# Altium integrated library Weidmueller_OMNIMATE_Signal.IntLib: 2550 symbols (part 21 of 45)
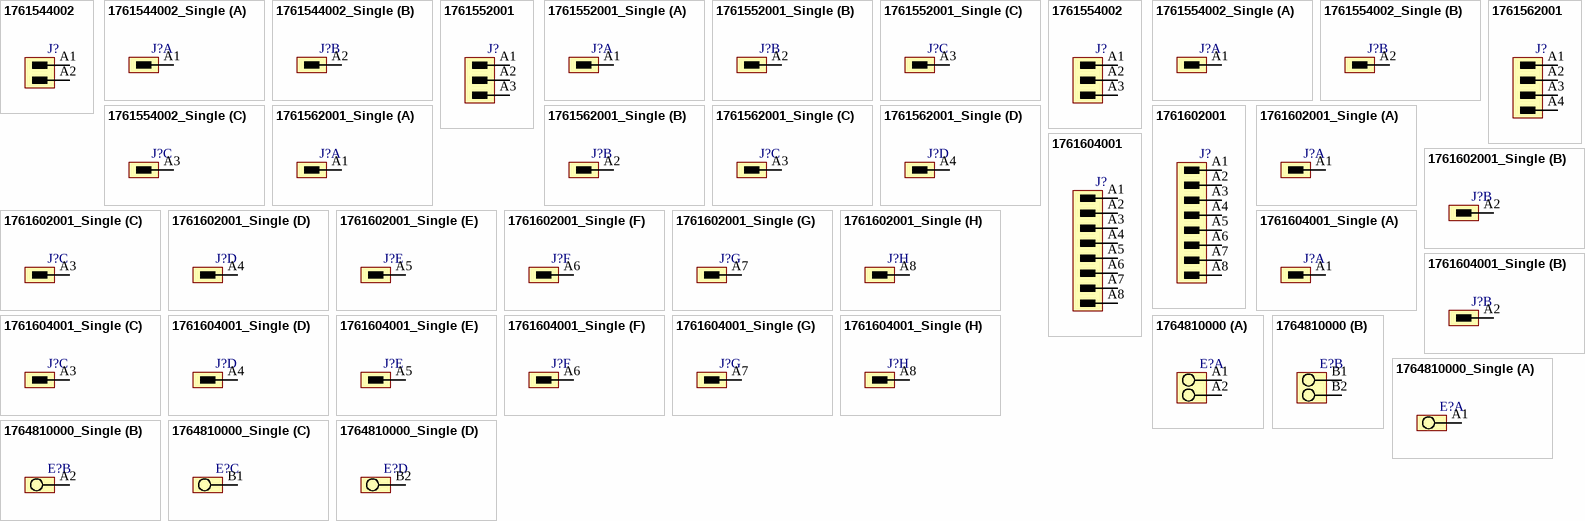
[diagram p231: symbols 1761544002 to 1764810000_Single]

## 1764810000_Single
designator E?
OMNIMATE Signal - series LMZF; PartNumber: 1764810000; Manufacturer: Weidmueller; Short_text_for_material: LM2NZF 5.08/04/135 3.5SN OR BX; Side_termination_characteristic: closed side; Mounting_onto_the_PCB: Solder connection; Pitch_mm: 5,08 mm; Pitch_inch: 0,2 inch; No_of_poles: 4; Solder_pin_length_mm: 3,5 mm; Contact_material: Cu-Leg; Contact_surface: tinned; Insulating_material: PA; UL_94_flammability_rating: V-2; Rated_voltage_for_surge_voltage_class_pollution_degree_II_2: 630 V; Solid_min_H05_07_V_U: 0,2 mm²; Solid_max_H05_07_V_U: 2,5 mm²; Rated_voltage_use_group_B_UL_1059: 300 V; Rated_current_use_group_B_UL_1059: 10 A; Wire_cross_section_AWG_min_UL_1059: AWG 24; Wire_cross_section_AWG_max_UL_1059: AWG 14; PackageReference: LM2NZF_5_08_04; Colour: Orange; Packaging: Box; Qty: 50 PCS; Revision: V1; ComponentLink1Description: Manufacturer URL; ComponentLink1URL: http://www.weidmueller.com/; ComponentLink2Description: URL Link1; ComponentLink2URL: http://catalog.weidmueller.com/catalog/Start.do?localeId=en&ObjectID=1764810000
footprint LM2NZF_5_08_04 (OMNIMATE Signal - Serie LMZF  LM2NZF 5.08/04/135 3.5)
part A pins: A1
part B pins: A2
part C pins: B1
part D pins: B2
1 alternate drawing of the same symbol

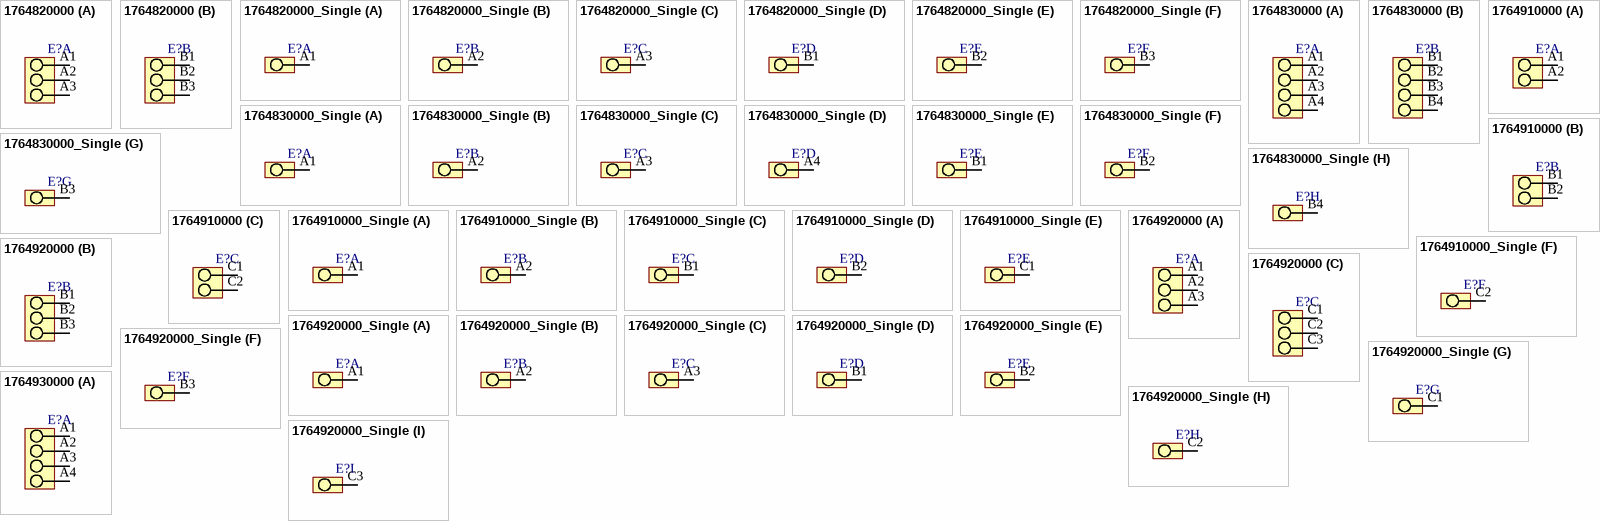
[diagram p113: symbols 1764820000 to 1764930000]

## 1764820000
designator E?
OMNIMATE Signal - series LMZF; PartNumber: 1764820000; Manufacturer: Weidmueller; Short_text_for_material: LM2NZF 5.08/06/135 3.5SN OR BX; Side_termination_characteristic: closed side; Mounting_onto_the_PCB: Solder connection; Pitch_mm: 5,08 mm; Pitch_inch: 0,2 inch; No_of_poles: 6; Solder_pin_length_mm: 3,5 mm; Contact_material: Cu-Leg; Contact_surface: tinned; Insulating_material: PA; UL_94_flammability_rating: V-2; Rated_voltage_for_surge_voltage_class_pollution_degree_II_2: 630 V; Solid_min_H05_07_V_U: 0,2 mm²; Solid_max_H05_07_V_U: 2,5 mm²; Rated_voltage_use_group_B_UL_1059: 300 V; Rated_current_use_group_B_UL_1059: 10 A; Wire_cross_section_AWG_min_UL_1059: AWG 24; Wire_cross_section_AWG_max_UL_1059: AWG 14; PackageReference: LM2NZF_5_08_06; Colour: Orange; Packaging: Box; Qty: 50 PCS; Revision: V1; ComponentLink1Description: Manufacturer URL; ComponentLink1URL: http://www.weidmueller.com/; ComponentLink2Description: URL Link1; ComponentLink2URL: http://catalog.weidmueller.com/catalog/Start.do?localeId=en&ObjectID=1764820000
footprint LM2NZF_5_08_06 (OMNIMATE Signal - Serie LMZF  LM2NZF 5.08/06/135 3.5)
part A pins: A1, A2, A3
part B pins: B1, B2, B3
1 alternate drawing of the same symbol

## 1764820000_Single
designator E?
OMNIMATE Signal - series LMZF; PartNumber: 1764820000; Manufacturer: Weidmueller; Short_text_for_material: LM2NZF 5.08/06/135 3.5SN OR BX; Side_termination_characteristic: closed side; Mounting_onto_the_PCB: Solder connection; Pitch_mm: 5,08 mm; Pitch_inch: 0,2 inch; No_of_poles: 6; Solder_pin_length_mm: 3,5 mm; Contact_material: Cu-Leg; Contact_surface: tinned; Insulating_material: PA; UL_94_flammability_rating: V-2; Rated_voltage_for_surge_voltage_class_pollution_degree_II_2: 630 V; Solid_min_H05_07_V_U: 0,2 mm²; Solid_max_H05_07_V_U: 2,5 mm²; Rated_voltage_use_group_B_UL_1059: 300 V; Rated_current_use_group_B_UL_1059: 10 A; Wire_cross_section_AWG_min_UL_1059: AWG 24; Wire_cross_section_AWG_max_UL_1059: AWG 14; PackageReference: LM2NZF_5_08_06; Colour: Orange; Packaging: Box; Qty: 50 PCS; Revision: V1; ComponentLink1Description: Manufacturer URL; ComponentLink1URL: http://www.weidmueller.com/; ComponentLink2Description: URL Link1; ComponentLink2URL: http://catalog.weidmueller.com/catalog/Start.do?localeId=en&ObjectID=1764820000
footprint LM2NZF_5_08_06 (OMNIMATE Signal - Serie LMZF  LM2NZF 5.08/06/135 3.5)
part A pins: A1
part B pins: A2
part C pins: A3
part D pins: B1
part E pins: B2
part F pins: B3
1 alternate drawing of the same symbol

## 1764830000
designator E?
OMNIMATE Signal - series LMZF; PartNumber: 1764830000; Manufacturer: Weidmueller; Short_text_for_material: LM2NZF 5.08/08/135 3.5SN OR BX; Side_termination_characteristic: closed side; Mounting_onto_the_PCB: Solder connection; Pitch_mm: 5,08 mm; Pitch_inch: 0,2 inch; No_of_poles: 8; Solder_pin_length_mm: 3,5 mm; Contact_material: Cu-Leg; Contact_surface: tinned; Insulating_material: PA; UL_94_flammability_rating: V-2; Rated_voltage_for_surge_voltage_class_pollution_degree_II_2: 630 V; Solid_min_H05_07_V_U: 0,2 mm²; Solid_max_H05_07_V_U: 2,5 mm²; Rated_voltage_use_group_B_UL_1059: 300 V; Rated_current_use_group_B_UL_1059: 10 A; Wire_cross_section_AWG_min_UL_1059: AWG 24; Wire_cross_section_AWG_max_UL_1059: AWG 14; PackageReference: LM2NZF_5_08_08; Colour: Orange; Packaging: Box; Qty: 50 PCS; Revision: V1; ComponentLink1Description: Manufacturer URL; ComponentLink1URL: http://www.weidmueller.com/; ComponentLink2Description: URL Link1; ComponentLink2URL: http://catalog.weidmueller.com/catalog/Start.do?localeId=en&ObjectID=1764830000
footprint LM2NZF_5_08_08 (OMNIMATE Signal - Serie LMZF  LM2NZF 5.08/08/135 3.5)
part A pins: A1, A2, A3, A4
part B pins: B1, B2, B3, B4
1 alternate drawing of the same symbol

## 1764830000_Single
designator E?
OMNIMATE Signal - series LMZF; PartNumber: 1764830000; Manufacturer: Weidmueller; Short_text_for_material: LM2NZF 5.08/08/135 3.5SN OR BX; Side_termination_characteristic: closed side; Mounting_onto_the_PCB: Solder connection; Pitch_mm: 5,08 mm; Pitch_inch: 0,2 inch; No_of_poles: 8; Solder_pin_length_mm: 3,5 mm; Contact_material: Cu-Leg; Contact_surface: tinned; Insulating_material: PA; UL_94_flammability_rating: V-2; Rated_voltage_for_surge_voltage_class_pollution_degree_II_2: 630 V; Solid_min_H05_07_V_U: 0,2 mm²; Solid_max_H05_07_V_U: 2,5 mm²; Rated_voltage_use_group_B_UL_1059: 300 V; Rated_current_use_group_B_UL_1059: 10 A; Wire_cross_section_AWG_min_UL_1059: AWG 24; Wire_cross_section_AWG_max_UL_1059: AWG 14; PackageReference: LM2NZF_5_08_08; Colour: Orange; Packaging: Box; Qty: 50 PCS; Revision: V1; ComponentLink1Description: Manufacturer URL; ComponentLink1URL: http://www.weidmueller.com/; ComponentLink2Description: URL Link1; ComponentLink2URL: http://catalog.weidmueller.com/catalog/Start.do?localeId=en&ObjectID=1764830000
footprint LM2NZF_5_08_08 (OMNIMATE Signal - Serie LMZF  LM2NZF 5.08/08/135 3.5)
part A pins: A1
part B pins: A2
part C pins: A3
part D pins: A4
part E pins: B1
part F pins: B2
part G pins: B3
part H pins: B4
1 alternate drawing of the same symbol

## 1764910000
designator E?
OMNIMATE Signal - series LMZF; PartNumber: 1764910000; Manufacturer: Weidmueller; Short_text_for_material: LM3RZF 5.08/06/135 3.5SN OR BX; Side_termination_characteristic: closed side; Mounting_onto_the_PCB: Solder connection; Pitch_mm: 5,08 mm; Pitch_inch: 0,2 inch; No_of_poles: 6; Solder_pin_length_mm: 3,5 mm; Contact_material: Cu-Leg; Contact_surface: tinned; Insulating_material: PA; UL_94_flammability_rating: V-2; Rated_voltage_for_surge_voltage_class_pollution_degree_II_2: 630 V; Solid_min_H05_07_V_U: 0,2 mm²; Solid_max_H05_07_V_U: 2,5 mm²; Rated_voltage_use_group_B_UL_1059: 300 V; Rated_current_use_group_B_UL_1059: 10 A; Wire_cross_section_AWG_min_UL_1059: AWG 24; Wire_cross_section_AWG_max_UL_1059: AWG 14; PackageReference: LM3RZF_5_08_06; Colour: Orange; Packaging: Box; Qty: 50 PCS; Revision: V1; ComponentLink1Description: Manufacturer URL; ComponentLink1URL: http://www.weidmueller.com/; ComponentLink2Description: URL Link1; ComponentLink2URL: http://catalog.weidmueller.com/catalog/Start.do?localeId=en&ObjectID=1764910000
footprint LM3RZF_5_08_06 (OMNIMATE Signal - Serie LMZF  LM3RZF 5.08/06/135 3.5)
part A pins: A1, A2
part B pins: B1, B2
part C pins: C1, C2
1 alternate drawing of the same symbol

## 1764910000_Single
designator E?
OMNIMATE Signal - series LMZF; PartNumber: 1764910000; Manufacturer: Weidmueller; Short_text_for_material: LM3RZF 5.08/06/135 3.5SN OR BX; Side_termination_characteristic: closed side; Mounting_onto_the_PCB: Solder connection; Pitch_mm: 5,08 mm; Pitch_inch: 0,2 inch; No_of_poles: 6; Solder_pin_length_mm: 3,5 mm; Contact_material: Cu-Leg; Contact_surface: tinned; Insulating_material: PA; UL_94_flammability_rating: V-2; Rated_voltage_for_surge_voltage_class_pollution_degree_II_2: 630 V; Solid_min_H05_07_V_U: 0,2 mm²; Solid_max_H05_07_V_U: 2,5 mm²; Rated_voltage_use_group_B_UL_1059: 300 V; Rated_current_use_group_B_UL_1059: 10 A; Wire_cross_section_AWG_min_UL_1059: AWG 24; Wire_cross_section_AWG_max_UL_1059: AWG 14; PackageReference: LM3RZF_5_08_06; Colour: Orange; Packaging: Box; Qty: 50 PCS; Revision: V1; ComponentLink1Description: Manufacturer URL; ComponentLink1URL: http://www.weidmueller.com/; ComponentLink2Description: URL Link1; ComponentLink2URL: http://catalog.weidmueller.com/catalog/Start.do?localeId=en&ObjectID=1764910000
footprint LM3RZF_5_08_06 (OMNIMATE Signal - Serie LMZF  LM3RZF 5.08/06/135 3.5)
part A pins: A1
part B pins: A2
part C pins: B1
part D pins: B2
part E pins: C1
part F pins: C2
1 alternate drawing of the same symbol

## 1764920000
designator E?
OMNIMATE Signal - series LMZF; PartNumber: 1764920000; Manufacturer: Weidmueller; Short_text_for_material: LM3RZF 5.08/09/135 3.5SN OR BX; Side_termination_characteristic: closed side; Mounting_onto_the_PCB: Solder connection; Pitch_mm: 5,08 mm; Pitch_inch: 0,2 inch; No_of_poles: 9; Solder_pin_length_mm: 3,5 mm; Contact_material: Cu-Leg; Contact_surface: tinned; Insulating_material: PA; UL_94_flammability_rating: V-2; Rated_voltage_for_surge_voltage_class_pollution_degree_II_2: 630 V; Solid_min_H05_07_V_U: 0,2 mm²; Solid_max_H05_07_V_U: 2,5 mm²; Rated_voltage_use_group_B_UL_1059: 300 V; Rated_current_use_group_B_UL_1059: 10 A; Wire_cross_section_AWG_min_UL_1059: AWG 24; Wire_cross_section_AWG_max_UL_1059: AWG 14; PackageReference: LM3RZF_5_08_09; Colour: Orange; Packaging: Box; Qty: 50 PCS; Revision: V1; ComponentLink1Description: Manufacturer URL; ComponentLink1URL: http://www.weidmueller.com/; ComponentLink2Description: URL Link1; ComponentLink2URL: http://catalog.weidmueller.com/catalog/Start.do?localeId=en&ObjectID=1764920000
footprint LM3RZF_5_08_09 (OMNIMATE Signal - Serie LMZF  LM3RZF 5.08/9/135 3.5)
part A pins: A1, A2, A3
part B pins: B1, B2, B3
part C pins: C1, C2, C3
1 alternate drawing of the same symbol

## 1764920000_Single
designator E?
OMNIMATE Signal - series LMZF; PartNumber: 1764920000; Manufacturer: Weidmueller; Short_text_for_material: LM3RZF 5.08/09/135 3.5SN OR BX; Side_termination_characteristic: closed side; Mounting_onto_the_PCB: Solder connection; Pitch_mm: 5,08 mm; Pitch_inch: 0,2 inch; No_of_poles: 9; Solder_pin_length_mm: 3,5 mm; Contact_material: Cu-Leg; Contact_surface: tinned; Insulating_material: PA; UL_94_flammability_rating: V-2; Rated_voltage_for_surge_voltage_class_pollution_degree_II_2: 630 V; Solid_min_H05_07_V_U: 0,2 mm²; Solid_max_H05_07_V_U: 2,5 mm²; Rated_voltage_use_group_B_UL_1059: 300 V; Rated_current_use_group_B_UL_1059: 10 A; Wire_cross_section_AWG_min_UL_1059: AWG 24; Wire_cross_section_AWG_max_UL_1059: AWG 14; PackageReference: LM3RZF_5_08_09; Colour: Orange; Packaging: Box; Qty: 50 PCS; Revision: V1; ComponentLink1Description: Manufacturer URL; ComponentLink1URL: http://www.weidmueller.com/; ComponentLink2Description: URL Link1; ComponentLink2URL: http://catalog.weidmueller.com/catalog/Start.do?localeId=en&ObjectID=1764920000
footprint LM3RZF_5_08_09 (OMNIMATE Signal - Serie LMZF  LM3RZF 5.08/9/135 3.5)
part A pins: A1
part B pins: A2
part C pins: A3
part D pins: B1
part E pins: B2
part F pins: B3
part G pins: C1
part H pins: C2
part I pins: C3
1 alternate drawing of the same symbol

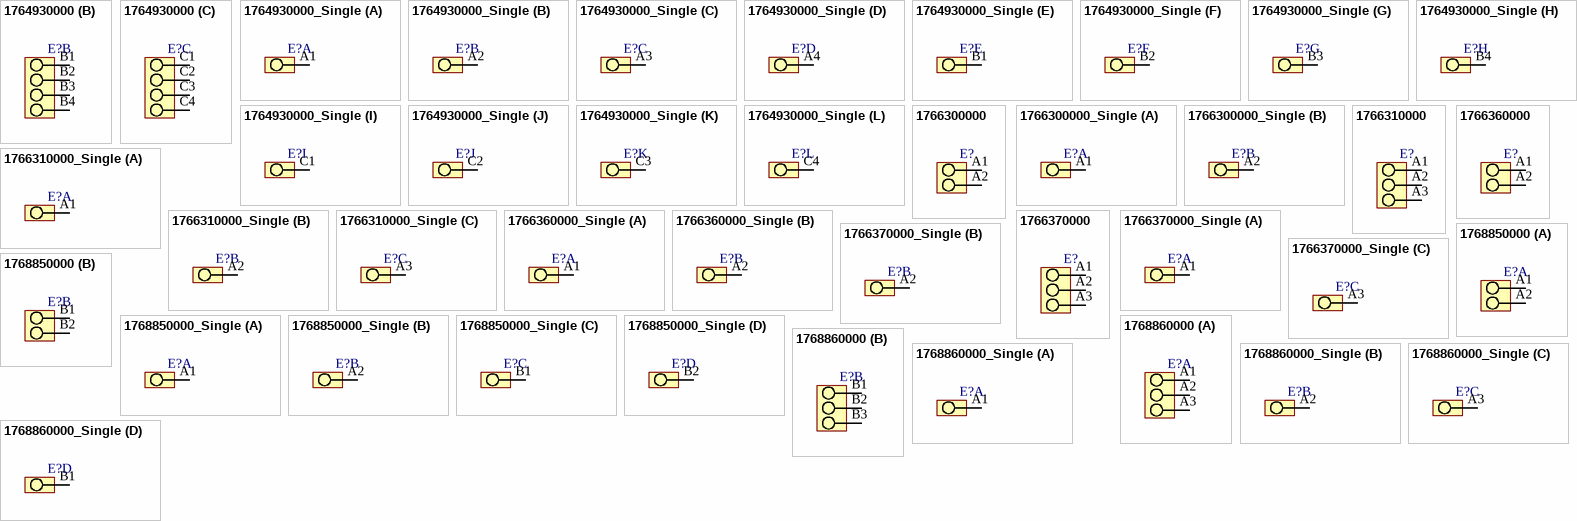
[diagram p114: symbols 1764930000 to 1768860000_Single]

## 1764930000
designator E?
OMNIMATE Signal - series LMZF; PartNumber: 1764930000; Manufacturer: Weidmueller; Short_text_for_material: LM3RZF 5.08/12/135 3.5SN OR BX; Side_termination_characteristic: closed side; Mounting_onto_the_PCB: Solder connection; Pitch_mm: 5,08 mm; Pitch_inch: 0,2 inch; No_of_poles: 12; Solder_pin_length_mm: 3,5 mm; Contact_material: Cu-Leg; Contact_surface: tinned; Insulating_material: PA; UL_94_flammability_rating: V-2; Rated_voltage_for_surge_voltage_class_pollution_degree_II_2: 630 V; Solid_min_H05_07_V_U: 0,2 mm²; Solid_max_H05_07_V_U: 2,5 mm²; Rated_voltage_use_group_B_UL_1059: 300 V; Rated_current_use_group_B_UL_1059: 10 A; Wire_cross_section_AWG_min_UL_1059: AWG 24; Wire_cross_section_AWG_max_UL_1059: AWG 14; PackageReference: LM3RZF_5_08_12; Colour: Orange; Packaging: Box; Qty: 50 PCS; Revision: V1; ComponentLink1Description: Manufacturer URL; ComponentLink1URL: http://www.weidmueller.com/; ComponentLink2Description: URL Link1; ComponentLink2URL: http://catalog.weidmueller.com/catalog/Start.do?localeId=en&ObjectID=1764930000
footprint LM3RZF_5_08_12 (OMNIMATE Signal - Serie LMZF  LM3RZF 5.08/12/135 3.5)
part A pins: A1, A2, A3, A4
part B pins: B1, B2, B3, B4
part C pins: C1, C2, C3, C4
1 alternate drawing of the same symbol

## 1764930000_Single
designator E?
OMNIMATE Signal - series LMZF; PartNumber: 1764930000; Manufacturer: Weidmueller; Short_text_for_material: LM3RZF 5.08/12/135 3.5SN OR BX; Side_termination_characteristic: closed side; Mounting_onto_the_PCB: Solder connection; Pitch_mm: 5,08 mm; Pitch_inch: 0,2 inch; No_of_poles: 12; Solder_pin_length_mm: 3,5 mm; Contact_material: Cu-Leg; Contact_surface: tinned; Insulating_material: PA; UL_94_flammability_rating: V-2; Rated_voltage_for_surge_voltage_class_pollution_degree_II_2: 630 V; Solid_min_H05_07_V_U: 0,2 mm²; Solid_max_H05_07_V_U: 2,5 mm²; Rated_voltage_use_group_B_UL_1059: 300 V; Rated_current_use_group_B_UL_1059: 10 A; Wire_cross_section_AWG_min_UL_1059: AWG 24; Wire_cross_section_AWG_max_UL_1059: AWG 14; PackageReference: LM3RZF_5_08_12; Colour: Orange; Packaging: Box; Qty: 50 PCS; Revision: V1; ComponentLink1Description: Manufacturer URL; ComponentLink1URL: http://www.weidmueller.com/; ComponentLink2Description: URL Link1; ComponentLink2URL: http://catalog.weidmueller.com/catalog/Start.do?localeId=en&ObjectID=1764930000
footprint LM3RZF_5_08_12 (OMNIMATE Signal - Serie LMZF  LM3RZF 5.08/12/135 3.5)
part A pins: A1
part B pins: A2
part C pins: A3
part D pins: A4
part E pins: B1
part F pins: B2
part G pins: B3
part H pins: B4
part I pins: C1
part J pins: C2
part K pins: C3
part L pins: C4
1 alternate drawing of the same symbol

## 1766300000
designator E?
OMNIMATE Signal - series LM; PartNumber: 1766300000; Manufacturer: Weidmueller; Short_text_for_material: LM1N 5.08/02/90 3.5SN OR BX; Side_termination_characteristic: closed side; Mounting_onto_the_PCB: Solder connection; Pitch_mm: 5,08 mm; Pitch_inch: 0,2 inch; No_of_poles: 2; Solder_pin_length_mm: 3,5 mm; Contact_material: Cu-Leg; Contact_surface: tinned; Insulating_material: Wemid (PA); UL_94_flammability_rating: V-0; Rated_voltage_for_surge_voltage_class_pollution_degree_II_2: 630 V; Solid_min_H05_07_V_U: 0,2 mm²; Solid_max_H05_07_V_U: 2,5 mm²; Rated_voltage_use_group_B_UL_1059: 300 V; Rated_current_use_group_B_UL_1059: 15 A; Wire_cross_section_AWG_min_UL_1059: AWG 24; Wire_cross_section_AWG_max_UL_1059: AWG 14; PackageReference: LM1N_5_08_02; Colour: Orange; Packaging: Box; Qty: 100 PCS; Revision: V1; ComponentLink1Description: Manufacturer URL; ComponentLink1URL: http://www.weidmueller.com/; ComponentLink2Description: URL Link1; ComponentLink2URL: http://catalog.weidmueller.com/catalog/Start.do?localeId=en&ObjectID=1766300000
footprint LM1N_5_08_02 (OMNIMATE Signal - Serie LM  LM1N 5.08/02/90 3.5)
pins: A1, A2
1 alternate drawing of the same symbol

## 1766300000_Single
designator E?
OMNIMATE Signal - series LM; PartNumber: 1766300000; Manufacturer: Weidmueller; Short_text_for_material: LM1N 5.08/02/90 3.5SN OR BX; Side_termination_characteristic: closed side; Mounting_onto_the_PCB: Solder connection; Pitch_mm: 5,08 mm; Pitch_inch: 0,2 inch; No_of_poles: 2; Solder_pin_length_mm: 3,5 mm; Contact_material: Cu-Leg; Contact_surface: tinned; Insulating_material: Wemid (PA); UL_94_flammability_rating: V-0; Rated_voltage_for_surge_voltage_class_pollution_degree_II_2: 630 V; Solid_min_H05_07_V_U: 0,2 mm²; Solid_max_H05_07_V_U: 2,5 mm²; Rated_voltage_use_group_B_UL_1059: 300 V; Rated_current_use_group_B_UL_1059: 15 A; Wire_cross_section_AWG_min_UL_1059: AWG 24; Wire_cross_section_AWG_max_UL_1059: AWG 14; PackageReference: LM1N_5_08_02; Colour: Orange; Packaging: Box; Qty: 100 PCS; Revision: V1; ComponentLink1Description: Manufacturer URL; ComponentLink1URL: http://www.weidmueller.com/; ComponentLink2Description: URL Link1; ComponentLink2URL: http://catalog.weidmueller.com/catalog/Start.do?localeId=en&ObjectID=1766300000
footprint LM1N_5_08_02 (OMNIMATE Signal - Serie LM  LM1N 5.08/02/90 3.5)
part A pins: A1
part B pins: A2
1 alternate drawing of the same symbol

## 1766310000
designator E?
OMNIMATE Signal - series LM; PartNumber: 1766310000; Manufacturer: Weidmueller; Short_text_for_material: LM1N 5.08/03/90 3.5SN OR BX; Side_termination_characteristic: closed side; Mounting_onto_the_PCB: Solder connection; Pitch_mm: 5,08 mm; Pitch_inch: 0,2 inch; No_of_poles: 3; Solder_pin_length_mm: 3,5 mm; Contact_material: Cu-Leg; Contact_surface: tinned; Insulating_material: Wemid (PA); UL_94_flammability_rating: V-0; Rated_voltage_for_surge_voltage_class_pollution_degree_II_2: 630 V; Solid_min_H05_07_V_U: 0,2 mm²; Solid_max_H05_07_V_U: 2,5 mm²; Rated_voltage_use_group_B_UL_1059: 300 V; Rated_current_use_group_B_UL_1059: 15 A; Wire_cross_section_AWG_min_UL_1059: AWG 24; Wire_cross_section_AWG_max_UL_1059: AWG 14; PackageReference: LM1N_5_08_03; Colour: Orange; Packaging: Box; Qty: 100 PCS; Revision: V1; ComponentLink1Description: Manufacturer URL; ComponentLink1URL: http://www.weidmueller.com/; ComponentLink2Description: URL Link1; ComponentLink2URL: http://catalog.weidmueller.com/catalog/Start.do?localeId=en&ObjectID=1766310000
footprint LM1N_5_08_03 (OMNIMATE Signal - Serie LM  LM1N 5.08/03/90 3.5)
pins: A1, A2, A3
1 alternate drawing of the same symbol

## 1766310000_Single
designator E?
OMNIMATE Signal - series LM; PartNumber: 1766310000; Manufacturer: Weidmueller; Short_text_for_material: LM1N 5.08/03/90 3.5SN OR BX; Side_termination_characteristic: closed side; Mounting_onto_the_PCB: Solder connection; Pitch_mm: 5,08 mm; Pitch_inch: 0,2 inch; No_of_poles: 3; Solder_pin_length_mm: 3,5 mm; Contact_material: Cu-Leg; Contact_surface: tinned; Insulating_material: Wemid (PA); UL_94_flammability_rating: V-0; Rated_voltage_for_surge_voltage_class_pollution_degree_II_2: 630 V; Solid_min_H05_07_V_U: 0,2 mm²; Solid_max_H05_07_V_U: 2,5 mm²; Rated_voltage_use_group_B_UL_1059: 300 V; Rated_current_use_group_B_UL_1059: 15 A; Wire_cross_section_AWG_min_UL_1059: AWG 24; Wire_cross_section_AWG_max_UL_1059: AWG 14; PackageReference: LM1N_5_08_03; Colour: Orange; Packaging: Box; Qty: 100 PCS; Revision: V1; ComponentLink1Description: Manufacturer URL; ComponentLink1URL: http://www.weidmueller.com/; ComponentLink2Description: URL Link1; ComponentLink2URL: http://catalog.weidmueller.com/catalog/Start.do?localeId=en&ObjectID=1766310000
footprint LM1N_5_08_03 (OMNIMATE Signal - Serie LM  LM1N 5.08/03/90 3.5)
part A pins: A1
part B pins: A2
part C pins: A3
1 alternate drawing of the same symbol

## 1766360000
designator E?
OMNIMATE Signal - series LM; PartNumber: 1766360000; Manufacturer: Weidmueller; Short_text_for_material: LM1H 5.08/02/90 3.5SN OR BX; Side_termination_characteristic: closed side; Mounting_onto_the_PCB: Solder connection; Pitch_mm: 5,08 mm; Pitch_inch: 0,2 inch; No_of_poles: 2; Solder_pin_length_mm: 3,5 mm; Contact_material: Cu-Leg; Contact_surface: tinned; Insulating_material: Wemid (PA); UL_94_flammability_rating: V-0; Rated_voltage_for_surge_voltage_class_pollution_degree_II_2: 630 V; Solid_min_H05_07_V_U: 0,2 mm²; Solid_max_H05_07_V_U: 2,5 mm²; Rated_voltage_use_group_B_UL_1059: 300 V; Rated_current_use_group_B_UL_1059: 15 A; Wire_cross_section_AWG_min_UL_1059: AWG 24; Wire_cross_section_AWG_max_UL_1059: AWG 14; PackageReference: LM1H_5_08_02; Colour: Orange; Packaging: Box; Qty: 100 PCS; Revision: V1; ComponentLink1Description: Manufacturer URL; ComponentLink1URL: http://www.weidmueller.com/; ComponentLink2Description: URL Link1; ComponentLink2URL: http://catalog.weidmueller.com/catalog/Start.do?localeId=en&ObjectID=1766360000
footprint LM1H_5_08_02 (OMNIMATE Signal - Serie LM  LM1H 5.08/02/90 3.5)
pins: A1, A2
1 alternate drawing of the same symbol

## 1766360000_Single
designator E?
OMNIMATE Signal - series LM; PartNumber: 1766360000; Manufacturer: Weidmueller; Short_text_for_material: LM1H 5.08/02/90 3.5SN OR BX; Side_termination_characteristic: closed side; Mounting_onto_the_PCB: Solder connection; Pitch_mm: 5,08 mm; Pitch_inch: 0,2 inch; No_of_poles: 2; Solder_pin_length_mm: 3,5 mm; Contact_material: Cu-Leg; Contact_surface: tinned; Insulating_material: Wemid (PA); UL_94_flammability_rating: V-0; Rated_voltage_for_surge_voltage_class_pollution_degree_II_2: 630 V; Solid_min_H05_07_V_U: 0,2 mm²; Solid_max_H05_07_V_U: 2,5 mm²; Rated_voltage_use_group_B_UL_1059: 300 V; Rated_current_use_group_B_UL_1059: 15 A; Wire_cross_section_AWG_min_UL_1059: AWG 24; Wire_cross_section_AWG_max_UL_1059: AWG 14; PackageReference: LM1H_5_08_02; Colour: Orange; Packaging: Box; Qty: 100 PCS; Revision: V1; ComponentLink1Description: Manufacturer URL; ComponentLink1URL: http://www.weidmueller.com/; ComponentLink2Description: URL Link1; ComponentLink2URL: http://catalog.weidmueller.com/catalog/Start.do?localeId=en&ObjectID=1766360000
footprint LM1H_5_08_02 (OMNIMATE Signal - Serie LM  LM1H 5.08/02/90 3.5)
part A pins: A1
part B pins: A2
1 alternate drawing of the same symbol

## 1766370000
designator E?
OMNIMATE Signal - series LM; PartNumber: 1766370000; Manufacturer: Weidmueller; Short_text_for_material: LM1H 5.08/03/90 3.5SN OR BX; Side_termination_characteristic: closed side; Mounting_onto_the_PCB: Solder connection; Pitch_mm: 5,08 mm; Pitch_inch: 0,2 inch; No_of_poles: 3; Solder_pin_length_mm: 3,5 mm; Contact_material: Cu-Leg; Contact_surface: tinned; Insulating_material: Wemid (PA); UL_94_flammability_rating: V-0; Rated_voltage_for_surge_voltage_class_pollution_degree_II_2: 630 V; Solid_min_H05_07_V_U: 0,2 mm²; Solid_max_H05_07_V_U: 2,5 mm²; Rated_voltage_use_group_B_UL_1059: 300 V; Rated_current_use_group_B_UL_1059: 15 A; Wire_cross_section_AWG_min_UL_1059: AWG 24; Wire_cross_section_AWG_max_UL_1059: AWG 14; PackageReference: LM1H_5_08_03; Colour: Orange; Packaging: Box; Qty: 100 PCS; Revision: V1; ComponentLink1Description: Manufacturer URL; ComponentLink1URL: http://www.weidmueller.com/; ComponentLink2Description: URL Link1; ComponentLink2URL: http://catalog.weidmueller.com/catalog/Start.do?localeId=en&ObjectID=1766370000
footprint LM1H_5_08_03 (OMNIMATE Signal - Serie LM  LM1H 5.08/03/90 3.5)
pins: A1, A2, A3
1 alternate drawing of the same symbol

## 1766370000_Single
designator E?
OMNIMATE Signal - series LM; PartNumber: 1766370000; Manufacturer: Weidmueller; Short_text_for_material: LM1H 5.08/03/90 3.5SN OR BX; Side_termination_characteristic: closed side; Mounting_onto_the_PCB: Solder connection; Pitch_mm: 5,08 mm; Pitch_inch: 0,2 inch; No_of_poles: 3; Solder_pin_length_mm: 3,5 mm; Contact_material: Cu-Leg; Contact_surface: tinned; Insulating_material: Wemid (PA); UL_94_flammability_rating: V-0; Rated_voltage_for_surge_voltage_class_pollution_degree_II_2: 630 V; Solid_min_H05_07_V_U: 0,2 mm²; Solid_max_H05_07_V_U: 2,5 mm²; Rated_voltage_use_group_B_UL_1059: 300 V; Rated_current_use_group_B_UL_1059: 15 A; Wire_cross_section_AWG_min_UL_1059: AWG 24; Wire_cross_section_AWG_max_UL_1059: AWG 14; PackageReference: LM1H_5_08_03; Colour: Orange; Packaging: Box; Qty: 100 PCS; Revision: V1; ComponentLink1Description: Manufacturer URL; ComponentLink1URL: http://www.weidmueller.com/; ComponentLink2Description: URL Link1; ComponentLink2URL: http://catalog.weidmueller.com/catalog/Start.do?localeId=en&ObjectID=1766370000
footprint LM1H_5_08_03 (OMNIMATE Signal - Serie LM  LM1H 5.08/03/90 3.5)
part A pins: A1
part B pins: A2
part C pins: A3
1 alternate drawing of the same symbol

## 1768850000
designator E?
OMNIMATE Signal - series LM; PartNumber: 1768850000; Manufacturer: Weidmueller; Short_text_for_material: LM2N 5.08/04/90 3.5SN OR BX; Side_termination_characteristic: closed side; Mounting_onto_the_PCB: Solder connection; Pitch_mm: 5,08 mm; Pitch_inch: 0,2 inch; No_of_poles: 4; Solder_pin_length_mm: 3,5 mm; Contact_material: Cu-Leg; Contact_surface: tinned; Insulating_material: Wemid (PA); UL_94_flammability_rating: V-0; Rated_voltage_for_surge_voltage_class_pollution_degree_II_2: 630 V; Solid_min_H05_07_V_U: 0,2 mm²; Solid_max_H05_07_V_U: 2,5 mm²; Rated_voltage_use_group_B_UL_1059: 300 V; Rated_current_use_group_B_UL_1059: 15 A; Wire_cross_section_AWG_min_UL_1059: AWG 24; Wire_cross_section_AWG_max_UL_1059: AWG 14; PackageReference: LM2N_5_08_04; Colour: Orange; Packaging: Box; Qty: 50 PCS; Revision: V1; ComponentLink1Description: Manufacturer URL; ComponentLink1URL: http://www.weidmueller.com/; ComponentLink2Description: URL Link1; ComponentLink2URL: http://catalog.weidmueller.com/catalog/Start.do?localeId=en&ObjectID=1768850000
footprint LM2N_5_08_04 (OMNIMATE Signal - Serie LM  LM2N 5.08/08/90 3.5)
part A pins: A1, A2
part B pins: B1, B2
1 alternate drawing of the same symbol

## 1768850000_Single
designator E?
OMNIMATE Signal - series LM; PartNumber: 1768850000; Manufacturer: Weidmueller; Short_text_for_material: LM2N 5.08/04/90 3.5SN OR BX; Side_termination_characteristic: closed side; Mounting_onto_the_PCB: Solder connection; Pitch_mm: 5,08 mm; Pitch_inch: 0,2 inch; No_of_poles: 4; Solder_pin_length_mm: 3,5 mm; Contact_material: Cu-Leg; Contact_surface: tinned; Insulating_material: Wemid (PA); UL_94_flammability_rating: V-0; Rated_voltage_for_surge_voltage_class_pollution_degree_II_2: 630 V; Solid_min_H05_07_V_U: 0,2 mm²; Solid_max_H05_07_V_U: 2,5 mm²; Rated_voltage_use_group_B_UL_1059: 300 V; Rated_current_use_group_B_UL_1059: 15 A; Wire_cross_section_AWG_min_UL_1059: AWG 24; Wire_cross_section_AWG_max_UL_1059: AWG 14; PackageReference: LM2N_5_08_04; Colour: Orange; Packaging: Box; Qty: 50 PCS; Revision: V1; ComponentLink1Description: Manufacturer URL; ComponentLink1URL: http://www.weidmueller.com/; ComponentLink2Description: URL Link1; ComponentLink2URL: http://catalog.weidmueller.com/catalog/Start.do?localeId=en&ObjectID=1768850000
footprint LM2N_5_08_04 (OMNIMATE Signal - Serie LM  LM2N 5.08/08/90 3.5)
part A pins: A1
part B pins: A2
part C pins: B1
part D pins: B2
1 alternate drawing of the same symbol

## 1768860000
designator E?
OMNIMATE Signal - series LM; PartNumber: 1768860000; Manufacturer: Weidmueller; Short_text_for_material: LM2N 5.08/06/90 3.5SN OR BX; Side_termination_characteristic: closed side; Mounting_onto_the_PCB: Solder connection; Pitch_mm: 5,08 mm; Pitch_inch: 0,2 inch; No_of_poles: 6; Solder_pin_length_mm: 3,5 mm; Contact_material: Cu-Leg; Contact_surface: tinned; Insulating_material: Wemid (PA); UL_94_flammability_rating: V-0; Rated_voltage_for_surge_voltage_class_pollution_degree_II_2: 630 V; Solid_min_H05_07_V_U: 0,2 mm²; Solid_max_H05_07_V_U: 2,5 mm²; Rated_voltage_use_group_B_UL_1059: 300 V; Rated_current_use_group_B_UL_1059: 15 A; Wire_cross_section_AWG_min_UL_1059: AWG 24; Wire_cross_section_AWG_max_UL_1059: AWG 14; PackageReference: LM2N_5_08_06; Colour: Orange; Packaging: Box; Qty: 50 PCS; Revision: V1; ComponentLink1Description: Manufacturer URL; ComponentLink1URL: http://www.weidmueller.com/; ComponentLink2Description: URL Link1; ComponentLink2URL: http://catalog.weidmueller.com/catalog/Start.do?localeId=en&ObjectID=1768860000
footprint LM2N_5_08_06 (OMNIMATE Signal - Serie LM  LM2N 5.08/08/90 3.5)
part A pins: A1, A2, A3
part B pins: B1, B2, B3
1 alternate drawing of the same symbol

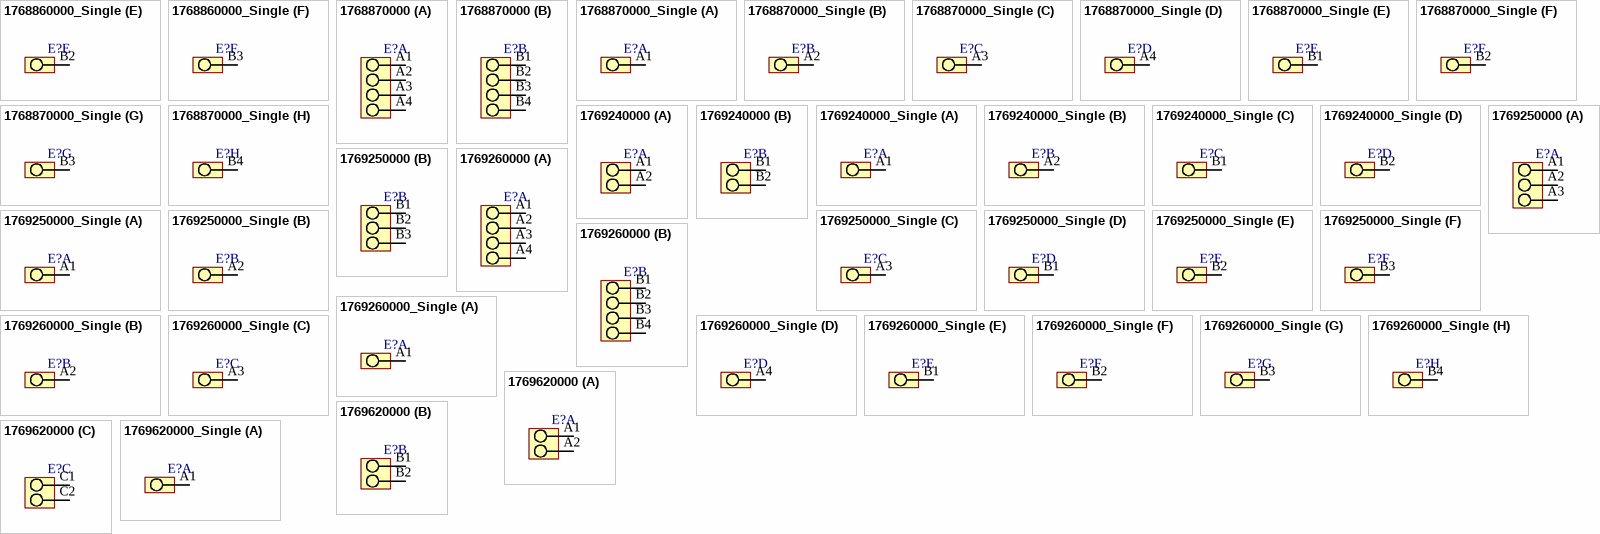
[diagram p115: symbols 1768860000_Single to 1769620000_Single]

## 1768860000_Single
designator E?
OMNIMATE Signal - series LM; PartNumber: 1768860000; Manufacturer: Weidmueller; Short_text_for_material: LM2N 5.08/06/90 3.5SN OR BX; Side_termination_characteristic: closed side; Mounting_onto_the_PCB: Solder connection; Pitch_mm: 5,08 mm; Pitch_inch: 0,2 inch; No_of_poles: 6; Solder_pin_length_mm: 3,5 mm; Contact_material: Cu-Leg; Contact_surface: tinned; Insulating_material: Wemid (PA); UL_94_flammability_rating: V-0; Rated_voltage_for_surge_voltage_class_pollution_degree_II_2: 630 V; Solid_min_H05_07_V_U: 0,2 mm²; Solid_max_H05_07_V_U: 2,5 mm²; Rated_voltage_use_group_B_UL_1059: 300 V; Rated_current_use_group_B_UL_1059: 15 A; Wire_cross_section_AWG_min_UL_1059: AWG 24; Wire_cross_section_AWG_max_UL_1059: AWG 14; PackageReference: LM2N_5_08_06; Colour: Orange; Packaging: Box; Qty: 50 PCS; Revision: V1; ComponentLink1Description: Manufacturer URL; ComponentLink1URL: http://www.weidmueller.com/; ComponentLink2Description: URL Link1; ComponentLink2URL: http://catalog.weidmueller.com/catalog/Start.do?localeId=en&ObjectID=1768860000
footprint LM2N_5_08_06 (OMNIMATE Signal - Serie LM  LM2N 5.08/08/90 3.5)
part A pins: A1
part B pins: A2
part C pins: A3
part D pins: B1
part E pins: B2
part F pins: B3
1 alternate drawing of the same symbol

## 1768870000
designator E?
OMNIMATE Signal - series LM; PartNumber: 1768870000; Manufacturer: Weidmueller; Short_text_for_material: LM2N 5.08/08/90 3.5SN OR BX; Side_termination_characteristic: closed side; Mounting_onto_the_PCB: Solder connection; Pitch_mm: 5,08 mm; Pitch_inch: 0,2 inch; No_of_poles: 8; Solder_pin_length_mm: 3,5 mm; Contact_material: Cu-Leg; Contact_surface: tinned; Insulating_material: Wemid (PA); UL_94_flammability_rating: V-0; Rated_voltage_for_surge_voltage_class_pollution_degree_II_2: 630 V; Solid_min_H05_07_V_U: 0,2 mm²; Solid_max_H05_07_V_U: 2,5 mm²; Rated_voltage_use_group_B_UL_1059: 300 V; Rated_current_use_group_B_UL_1059: 15 A; Wire_cross_section_AWG_min_UL_1059: AWG 24; Wire_cross_section_AWG_max_UL_1059: AWG 14; PackageReference: LM2N_5_08_08; Colour: Orange; Packaging: Box; Qty: 50 PCS; Revision: V1; ComponentLink1Description: Manufacturer URL; ComponentLink1URL: http://www.weidmueller.com/; ComponentLink2Description: URL Link1; ComponentLink2URL: http://catalog.weidmueller.com/catalog/Start.do?localeId=en&ObjectID=1768870000
footprint LM2N_5_08_08 (OMNIMATE Signal - Serie LM  LM2N 5.08/08/90 3.5)
part A pins: A1, A2, A3, A4
part B pins: B1, B2, B3, B4
1 alternate drawing of the same symbol